# Altium footprint library klp.PcbLib: 436 footprints (part 28 of 28)
Each footprint in its own frame and in the unit in brackets; x right, y up, seen from the top. Pads: shape width x height; smd on the part's side, far side on the other; paste and mask are expansions set on the pad; w line width, h text height; cw(c..) or ccw(c..) is an arc to the next point about the centre after c.
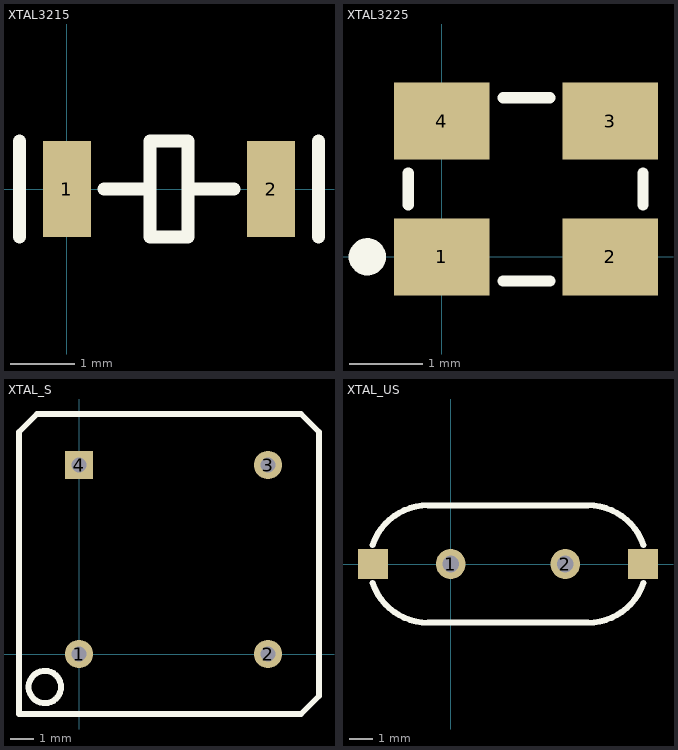
[diagram p27: the footprints below, top view; thin cyan lines are the x and y axes]

## XTAL3215 [mm]
pads (2):
  rect 0.75x1.5 smd: 1(0,0) 2(3.2,0)
Top Overlay:
  lines w0.203: -0.742,-0.75 -0.742,0.75 ; 0.578,0 1.3,0 ; 2,0 2.617,0 ; 3.942,-0.75 3.942,0.75 ; 1.3,-0.75 1.3,0.75 1.9,0.75 1.9,-0.75 1.3,-0.75

## XTAL3225 [mm]
pads (4):
  rect 1.3x1.05 smd: 1(0,0) 2(2.3,0) 3(2.3,1.85) 4(0,1.85)
Top Overlay:
  circle w0.254: c-1.016,0 r0.127
  lines w0.152: -0.457,0.711 -0.457,1.143 ; 0.838,-0.33 1.473,-0.33 ; 0.838,2.17 1.473,2.17 ; 2.743,0.711 2.743,1.143

## XTAL_S [mm] "XTAL_OSC"
height 3
pads (4):
  round 1.2 hole 0.635: 1(0,0) 2(8.001,0) 3(8.001,8.001)
  rect 1.2x1.2 hole 0.635: 4(0,8.001)
Top Overlay:
  circle w0.254: c-1.446,-1.397 r0.684
  lines w0.254: -2.54,-2.54 -2.54,8.509 -2.54,9.398 -1.778,10.16 9.398,10.16 10.16,9.398 10.16,-1.778 9.398,-2.54 -2.54,-2.54

## XTAL_US [mil]
pads (4):
  round 50 hole 28: 1(0,0) 2(192.13,0)
  rect 50x50 smd: ""(-130.32,0) ""(322.44,0)
Top Overlay:
  lines w10: -130.92,-31.85 ccw(c-37.79,0) -37.79,-98.42 ; -130.92,31.85 cw(c-37.79,0) -37.79,98.43 ; -38,98.42 229.92,98.43 cw(c229.92,0) 323.05,31.85 ; -37.8,-98.43 229.92,-98.42 ccw(c229.92,0) 323.05,-31.85